# Altium footprint library SWARMUS_LIB.PcbLib: 114 footprints (part 1 of 8)
Each footprint in its own frame and in the unit in brackets; x right, y up, seen from the top. Pads: shape width x height; smd on the part's side, far side on the other; paste and mask are expansions set on the pad; w line width, h text height; cw(c..) or ccw(c..) is an arc to the next point about the centre after c.
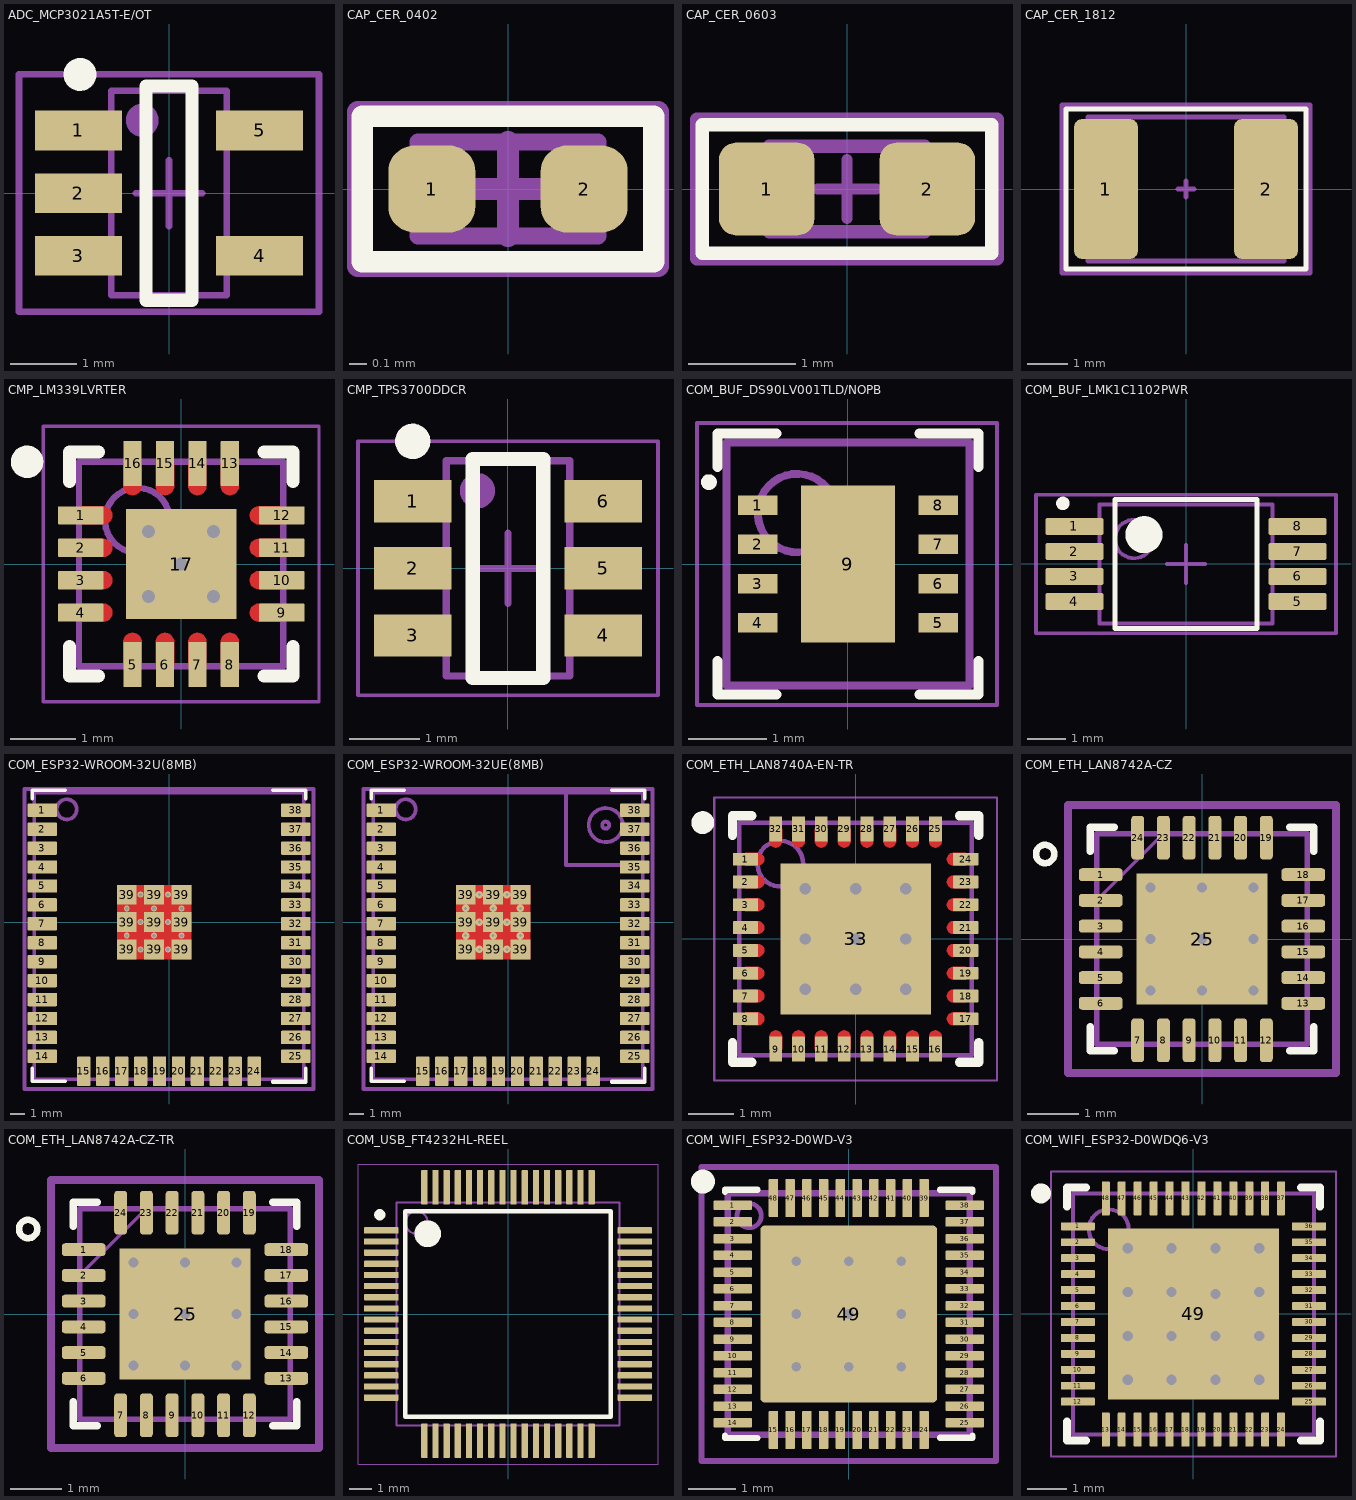
[diagram p0: the footprints below, top view; thin cyan lines are the x and y axes]

## ADC_MCP3021A5T-E/OT [mm]
pads (5):
  rect 1.321x0.6 smd paste-0.05 mask+0.07: 1(-1.375,0.95) 2(-1.375,0) 3(-1.375,-0.95) 4(1.375,-0.95) 5(1.375,0.95)
Top Overlay:
  circle w0.25: c-1.35,1.8 r0.125
  lines w0.2: 0.35,1.625 0.35,-1.625 -0.35,-1.625 -0.35,1.625 0.35,1.625
Top Assembly Drawing:
  circle w0.25: c-0.406,1.104 r0.125
  lines w0.1: -0.875,-1.55 0.875,-1.55 0.875,1.55 -0.875,1.55 -0.875,-1.55
Top Courtyard:
  lines w0.1: -0.5,0 0.5,0 ; 0,-0.5 0,0.5 ; -2.275,-1.8 -2.275,1.8 2.275,1.8 2.275,-1.8 -2.275,-1.8
3D body "SOT95P280X145-5N.step": height 1.45, standoff 0, extent -1.5,-1.55 1.5,1.55

## CAP_CER_0402 [mil] "Ceramic Capacitor - 0402"
height 23.62
pads (2):
  rrect60% 20x20 smd paste+0 mask+1.97: 1(-17.5,0) 2(17.5,0)
Top Overlay:
  lines w5: -33.46,-16.73 33.46,-16.73 33.46,16.73 -33.46,16.73 -33.46,-16.73
Top Assembly Drawing:
  lines w3.94: -20.67,-10.83 20.67,-10.83 20.67,10.83 -20.67,10.83 -20.67,-10.83
Top Courtyard:
  lines w5: -10.83,0 10.83,0 ; 0,-10.83 0,10.83 ; -34.45,-17.72 -34.45,17.72 34.45,17.72 34.45,-17.72 -34.45,-17.72
3D body "Cap0402.step": height 19.68, standoff 0, extent -19.37,-9.69 20,10

## CAP_CER_0603 [mil] "Ceramic Capacitor - 0603"
height 31.5
pads (2):
  rrect35% 35x34 smd paste+0 mask+1.97: 1(-29.5,0) 2(29.5,0)
Top Overlay:
  lines w5: -53.15,-23.62 53.15,-23.62 53.15,23.62 -53.15,23.62 -53.15,-23.62
Top Assembly Drawing:
  lines w5: -28.54,-15.75 28.54,-15.75 28.54,15.75 -28.54,15.75 -28.54,-15.75
Top Courtyard:
  lines w3.94: -10.83,0 10.83,0 ; 0,-10.83 0,10.83
  lines w5: -55.12,-25.59 55.12,-25.59 55.12,25.59 -55.12,25.59 -55.12,-25.59
3D body "Cap0603.step": height 35.43, standoff 0, extent -31.5,-15.75 31.5,15.75

## CAP_CER_1812 [mm]
height 2.8
pads (2):
  rrect25% 1.6x3.5 smd paste-0.025 mask+0.05: 1(-2,0) 2(2,0)
Top Overlay:
  lines w0.127: -3,-2 3,-2 3,2 -3,2 -3,-2
Top Assembly Drawing:
  lines w0.127: -2.45,-1.8 2.45,-1.8 2.45,1.8 -2.45,1.8 -2.45,-1.8
Top Courtyard:
  lines w0.127: -0.2,0 0.2,0 ; 0,-0.2 0,0.2 ; -3.1,-2.1 -3.1,2.1 3.1,2.1 3.1,-2.1 -3.1,-2.1
3D body "User Library-SMD Ceramic Capacitors_1812 (4532)_GE.step": height 1.3, standoff 0, extent -2.304,-1.6 2.304,1.6

## CMP_LM339LVRTER [mm] "WQFN-16"
height 0.8
pads (17):
  rrect10% 0.7x0.28 smd paste-0.025 mask+0.055: 1(-1.55,0.75) 2(-1.55,0.25) 3(-1.55,-0.25) 4(-1.55,-0.75) 9(1.55,-0.75) 10(1.55,-0.25) 11(1.55,0.25) 12(1.55,0.75)
  rrect10% 0.28x0.7 smd paste-0.025 mask+0.055: 5(-0.75,-1.55) 6(-0.25,-1.55) 7(0.25,-1.55) 8(0.75,-1.55) 13(0.75,1.55) 14(0.25,1.55) 15(-0.25,1.55) 16(-0.75,1.55)
  rect 1.7x1.7 smd paste-1.7 mask+0: 17(0,0)
via 0,0 diameter 0.5 hole 0.2
via -0.5,0.5 diameter 0.5 hole 0.2
via 0.5,0.5 diameter 0.5 hole 0.2
via 0.5,-0.5 diameter 0.5 hole 0.2
via -0.5,-0.5 diameter 0.5 hole 0.2
Top Layer:
  region: 0.39,-1.2 0.39,-1.186 0.385,-1.159 0.374,-1.134 0.359,-1.111 0.339,-1.091 0.316,-1.076 0.291,-1.065 0.264,-1.06 0.236,-1.06 0.209,-1.065 0.184,-1.076 0.161,-1.091 0.141,-1.111 0.126,-1.134 0.115,-1.159 0.11,-1.186 0.11,-1.2 0.11,-1.55 0.39,-1.55
  region: -0.11,-1.2 -0.11,-1.186 -0.115,-1.159 -0.126,-1.134 -0.141,-1.111 -0.161,-1.091 -0.184,-1.076 -0.209,-1.065 -0.236,-1.06 -0.264,-1.06 -0.291,-1.065 -0.316,-1.076 -0.339,-1.091 -0.359,-1.111 -0.374,-1.134 -0.385,-1.159 -0.39,-1.186 -0.39,-1.2 -0.39,-1.55 -0.11,-1.55
  region: -0.61,-1.2 -0.61,-1.186 -0.615,-1.159 -0.626,-1.134 -0.641,-1.111 -0.661,-1.091 -0.684,-1.076 -0.709,-1.065 -0.736,-1.06 -0.764,-1.06 -0.791,-1.065 -0.816,-1.076 -0.839,-1.091 -0.859,-1.111 -0.874,-1.134 -0.885,-1.159 -0.89,-1.186 -0.89,-1.2 -0.89,-1.55 -0.61,-1.55
  region: 0.89,-1.2 0.89,-1.186 0.885,-1.159 0.874,-1.134 0.859,-1.111 0.839,-1.091 0.816,-1.076 0.791,-1.065 0.764,-1.06 0.736,-1.06 0.709,-1.065 0.684,-1.076 0.661,-1.091 0.641,-1.111 0.626,-1.134 0.615,-1.159 0.61,-1.186 0.61,-1.2 0.61,-1.55 0.89,-1.55
  region: -1.2,-0.39 -1.186,-0.39 -1.159,-0.385 -1.134,-0.374 -1.111,-0.359 -1.091,-0.339 -1.076,-0.316 -1.065,-0.291 -1.06,-0.264 -1.06,-0.236 -1.065,-0.209 -1.076,-0.184 -1.091,-0.161 -1.111,-0.141 -1.134,-0.126 -1.159,-0.115 -1.186,-0.11 -1.2,-0.11 -1.55,-0.11 -1.55,-0.39
  region: -1.2,0.11 -1.186,0.11 -1.159,0.115 -1.134,0.126 -1.111,0.141 -1.091,0.161 -1.076,0.184 -1.065,0.209 -1.06,0.236 -1.06,0.264 -1.065,0.291 -1.076,0.316 -1.091,0.339 -1.111,0.359 -1.134,0.374 -1.159,0.385 -1.186,0.39 -1.2,0.39 -1.55,0.39 -1.55,0.11
  region: -1.2,0.61 -1.186,0.61 -1.159,0.615 -1.134,0.626 -1.111,0.641 -1.091,0.661 -1.076,0.684 -1.065,0.709 -1.06,0.736 -1.06,0.764 -1.065,0.791 -1.076,0.816 -1.091,0.839 -1.111,0.859 -1.134,0.874 -1.159,0.885 -1.186,0.89 -1.2,0.89 -1.55,0.89 -1.55,0.61
  region: -1.2,-0.89 -1.186,-0.89 -1.159,-0.885 -1.134,-0.874 -1.111,-0.859 -1.091,-0.839 -1.076,-0.816 -1.065,-0.791 -1.06,-0.764 -1.06,-0.736 -1.065,-0.709 -1.076,-0.684 -1.091,-0.661 -1.111,-0.641 -1.134,-0.626 -1.159,-0.615 -1.186,-0.61 -1.2,-0.61 -1.55,-0.61 -1.55,-0.89
  region: -0.39,1.2 -0.39,1.186 -0.385,1.159 -0.374,1.134 -0.359,1.111 -0.339,1.091 -0.316,1.076 -0.291,1.065 -0.264,1.06 -0.236,1.06 -0.209,1.065 -0.184,1.076 -0.161,1.091 -0.141,1.111 -0.126,1.134 -0.115,1.159 -0.11,1.186 -0.11,1.2 -0.11,1.55 -0.39,1.55
  region: 0.11,1.2 0.11,1.186 0.115,1.159 0.126,1.134 0.141,1.111 0.161,1.091 0.184,1.076 0.209,1.065 0.236,1.06 0.264,1.06 0.291,1.065 0.316,1.076 0.339,1.091 0.359,1.111 0.374,1.134 0.385,1.159 0.39,1.186 0.39,1.2 0.39,1.55 0.11,1.55
  region: 0.61,1.2 0.61,1.186 0.615,1.159 0.626,1.134 0.641,1.111 0.661,1.091 0.684,1.076 0.709,1.065 0.736,1.06 0.764,1.06 0.791,1.065 0.816,1.076 0.839,1.091 0.859,1.111 0.874,1.134 0.885,1.159 0.89,1.186 0.89,1.2 0.89,1.55 0.61,1.55
  region: -0.89,1.2 -0.89,1.186 -0.885,1.159 -0.874,1.134 -0.859,1.111 -0.839,1.091 -0.816,1.076 -0.791,1.065 -0.764,1.06 -0.736,1.06 -0.709,1.065 -0.684,1.076 -0.661,1.091 -0.641,1.111 -0.626,1.134 -0.615,1.159 -0.61,1.186 -0.61,1.2 -0.61,1.55 -0.89,1.55
  region: 1.2,0.39 1.186,0.39 1.159,0.385 1.134,0.374 1.111,0.359 1.091,0.339 1.076,0.316 1.065,0.291 1.06,0.264 1.06,0.236 1.065,0.209 1.076,0.184 1.091,0.161 1.111,0.141 1.134,0.126 1.159,0.115 1.186,0.11 1.2,0.11 1.55,0.11 1.55,0.39
  region: 1.2,-0.11 1.186,-0.11 1.159,-0.115 1.134,-0.126 1.111,-0.141 1.091,-0.161 1.076,-0.184 1.065,-0.209 1.06,-0.236 1.06,-0.264 1.065,-0.291 1.076,-0.316 1.091,-0.339 1.111,-0.359 1.134,-0.374 1.159,-0.385 1.186,-0.39 1.2,-0.39 1.55,-0.39 1.55,-0.11
  region: 1.2,-0.61 1.186,-0.61 1.159,-0.615 1.134,-0.626 1.111,-0.641 1.091,-0.661 1.076,-0.684 1.065,-0.709 1.06,-0.736 1.06,-0.764 1.065,-0.791 1.076,-0.816 1.091,-0.839 1.111,-0.859 1.134,-0.874 1.159,-0.885 1.186,-0.89 1.2,-0.89 1.55,-0.89 1.55,-0.61
  region: 1.2,0.89 1.186,0.89 1.159,0.885 1.134,0.874 1.111,0.859 1.091,0.839 1.076,0.816 1.065,0.791 1.06,0.764 1.06,0.736 1.065,0.709 1.076,0.684 1.091,0.661 1.111,0.641 1.134,0.626 1.159,0.615 1.186,0.61 1.2,0.61 1.55,0.61 1.55,0.89
Top Overlay:
  circle w0.25: c-2.375,1.575 r0.125
  lines w0.2: -1.725,-1.275 -1.725,-1.725 -1.275,-1.725 ; -1.725,1.275 -1.725,1.725 -1.275,1.725 ; 1.275,-1.725 1.725,-1.725 1.725,-1.275 ; 1.275,1.725 1.725,1.725 1.725,1.275
Top Paste:
  rectangle: -0.8,0.1 -0.1,0.8
  region: -0.1,-0.8 -0.1,-0.1 -0.8,-0.1 -0.8,-0.8
  region: 0.8,-0.1 0.1,-0.1 0.1,-0.8 0.8,-0.8
  region: 0.1,0.8 0.1,0.1 0.8,0.1 0.8,0.8
Top Assembly Drawing:
  circle w0.1: c-0.675,0.675 r0.5
  lines w0.1: -1.575,-1.575 -1.575,1.575 1.575,1.575 1.575,-1.575 -1.575,-1.575
Top Courtyard:
  lines w0.05: -2.125,-2.125 -2.125,2.125 2.125,2.125 2.125,-2.125 -2.125,-2.125
  lines w0.1: -0.5,0 0.5,0 ; 0,-0.5 0,0.5
3D body "QFN50P300X300X80_HS-17N.step": height 0.8, standoff 0, extent -1.576,-1.576 1.576,1.576

## CMP_TPS3700DDCR [mm]
height 1.12
pads (6):
  rect 1.1x0.6 smd paste+0 mask+0.07: 1(-1.35,0.95) 2(-1.35,0) 3(-1.35,-0.95) 4(1.35,-0.95) 5(1.35,0) 6(1.35,0.95)
Top Overlay:
  circle w0.25: c-1.35,1.8 r0.125
  lines w0.2: -0.5,-1.55 0.5,-1.55 0.5,1.55 -0.5,1.55 -0.5,-1.55
Top Assembly Drawing:
  circle w0.25: c-0.432,1.1 r0.125
  lines w0.1: -0.875,-1.525 -0.875,1.525 0.875,1.525 0.875,-1.525 -0.875,-1.525
Top Courtyard:
  lines w0.05: -2.125,-1.8 -2.125,1.8 2.125,1.8 2.125,-1.8 -2.125,-1.8
  lines w0.1: -0.5,0 0.5,0 ; 0,-0.5 0,0.5
3D body "SOT95P280X110-6N.step": height 1.1, standoff 0, extent -1.525,-1.525 1.525,1.525

## COM_BUF_DS90LV001TLD/NOPB [mm] "SON, 8-Leads, Body 3.00x3.00mm, Pitch 0.50mm, Thermal Pad 2.00x1.20mm, IPC Medium Density"
height 0.8
pads (9):
  rect 0.5x0.25 smd paste-0.025 mask+0.07: 1(-1.15,0.75) 2(-1.15,0.25) 3(-1.15,-0.25) 4(-1.15,-0.75) 5(1.15,-0.75) 6(1.15,-0.25) 7(1.15,0.25) 8(1.15,0.75)
  rect 1.2x2 smd paste-0.025 mask+0.07: 9(0,0)
Top Overlay:
  circle w0.1: c-1.773,1.044 r0.05
  lines w0.127: -1.664,-1.238 -1.664,-1.663 -0.908,-1.663 ; -1.664,1.239 -1.664,1.664 -0.908,1.664 ; 0.908,-1.663 1.663,-1.663 1.663,-1.238 ; 0.908,1.664 1.663,1.664 1.663,1.239
Top Assembly Drawing:
  circle w0.1: c-0.65,0.65 r0.5
  lines w0.1: -1.55,-1.55 -1.55,1.55 1.55,1.55 1.55,-1.55 -1.55,-1.55
Top Courtyard:
  lines w0.05: -1.925,-1.8 -1.925,1.8 1.9,1.8 1.9,-1.8 -1.925,-1.8
  lines w0.1: -0.5,0 0.5,0 ; 0,-0.5 0,0.5
3D body "SON50P300X80_HS-9N.step": height 0.8, standoff 0, extent -1.55,-1.55 1.55,1.55

## COM_BUF_LMK1C1102PWR [mm] "TSOP, 8-Leads, Body 3,00x4,40mm, Pitch 0,65mm, IPC Medium Density"
height 1.2
pads (8):
  rrect20% 1.5x0.45 smd paste-0.05 mask+0.05: 1(-2.9,0.975) 2(-2.9,0.325) 3(-2.9,-0.325) 4(-2.9,-0.975) 5(2.9,-0.975) 6(2.9,-0.325) 7(2.9,0.325) 8(2.9,0.975)
Top Overlay:
  circle w0.6: c-1.092,0.762 r0.18
  circle w0.25: c-3.2,1.575 r0.05
  lines w0.127: -1.85,-1.676 1.85,-1.676 1.85,1.676 -1.85,1.676 -1.85,-1.676
Top Assembly Drawing:
  circle w0.1: c-1.35,0.65 r0.5
  lines w0.1: -2.25,-1.55 2.25,-1.55 2.25,1.55 -2.25,1.55 -2.25,-1.55
Top Courtyard:
  lines w0.1: -0.5,0 0.5,0 ; 0,-0.5 0,0.5 ; -3.9,-1.8 -3.9,1.8 3.9,1.8 3.9,-1.8 -3.9,-1.8
3D body "COM_BUF_LMK1C1102PWR_1.step": height 1.2, standoff 0, extent -3.2,-1.55 3.2,1.55

## COM_ESP32-WROOM-32U(8MB) [mm]
pads (47):
  rrect20% 2x0.9 smd paste-0.025 mask+0.07: 1(-8.5,7.5) 2(-8.5,6.23) 3(-8.5,4.96) 4(-8.5,3.69) 5(-8.5,2.42) 6(-8.5,1.15) 7(-8.5,-0.12) 8(-8.5,-1.39) 9(-8.5,-2.66) 10(-8.5,-3.93) 11(-8.5,-5.2) 12(-8.5,-6.47) 13(-8.5,-7.74) 14(-8.5,-9.01) 25(8.5,-9.01) 26(8.5,-7.74) 27(8.5,-6.47) 28(8.5,-5.2) 29(8.5,-3.93) 30(8.5,-2.66) 31(8.5,-1.39) 32(8.5,-0.12) 33(8.5,1.15) 34(8.5,2.42) 35(8.5,3.69) 36(8.5,4.96) 37(8.5,6.23) 38(8.5,7.5)
  rrect20% 0.9x2 smd paste-0.025 mask+0.07: 15(-5.715,-10.01) 16(-4.445,-10.01) 17(-3.175,-10.01) 18(-1.905,-10.01) 19(-0.635,-10.01) 20(0.635,-10.01) 21(1.905,-10.01) 22(3.175,-10.01) 23(4.445,-10.01) 24(5.715,-10.01)
  rrect0% 1.33x1.33 smd paste-0.025 mask+0.07: 39(-2.835,-1.835) 39(-2.835,0) 39(-2.835,1.835) 39(-1,-1.835) 39(-1,0) 39(-1,1.835) 39(0.835,-1.835) 39(0.835,0) 39(0.835,1.835)
via -1,0.918 diameter 0.4 hole 0.254
via -2.835,0.918 diameter 0.4 hole 0.254
via 0.835,0.918 diameter 0.4 hole 0.254
via 0.835,-0.917 diameter 0.4 hole 0.254
via -2.835,-0.917 diameter 0.4 hole 0.254
via -0.083,1.835 diameter 0.4 hole 0.254
via -0.083,-1.835 diameter 0.4 hole 0.254
via -0.083,0 diameter 0.4 hole 0.254
via -1.917,1.835 diameter 0.4 hole 0.254
via -1.917,-1.835 diameter 0.4 hole 0.254
via -1.917,0 diameter 0.4 hole 0.254
via -1,-0.917 diameter 0.4 hole 0.254
Top Layer:
  rectangle: -3.5,-2.5 1.5,2.5
Top Overlay:
  lines w0.254: -9.173,-9.804 -9.173,-10.678 -6.967,-10.678 ; -9.173,8.294 -9.173,8.834 -6.967,8.834 ; 6.967,-10.729 9.173,-10.729 9.173,-9.856 ; 6.967,8.834 9.173,8.834 9.173,8.294 ; 9.173,-10.678 9.173,-9.804 9.173,-10.678 ; 9.173,-10.678 6.967,-10.678 9.173,-10.678
Top Assembly Drawing:
  circle w0.254: c-6.863,7.562 r0.675
  lines w0.254: -9.035,-10.55 9.035,-10.55 9.035,8.69 -9.035,8.69 -9.035,-10.55
Top Courtyard:
  lines w0.1: -0.5,0 0.5,0 ; 0,-0.5 0,0.5
  lines w0.254: -9.7,-11.2 -9.7,8.925 9.7,8.925 9.7,-11.2 -9.7,-11.2
3D body "ESp32-WROOM-32U v3.step": height 3.4, standoff -0.04, extent -9.035,-10.55 9.035,8.69

## COM_ESP32-WROOM-32UE(8MB) [mm]
pads (47):
  rrect20% 2x0.9 smd paste-0.025 mask+0.07: 1(-8.5,7.5) 2(-8.5,6.23) 3(-8.5,4.96) 4(-8.5,3.69) 5(-8.5,2.42) 6(-8.5,1.15) 7(-8.5,-0.12) 8(-8.5,-1.39) 9(-8.5,-2.66) 10(-8.5,-3.93) 11(-8.5,-5.2) 12(-8.5,-6.47) 13(-8.5,-7.74) 14(-8.5,-9.01) 25(8.5,-9.01) 26(8.5,-7.74) 27(8.5,-6.47) 28(8.5,-5.2) 29(8.5,-3.93) 30(8.5,-2.66) 31(8.5,-1.39) 32(8.5,-0.12) 33(8.5,1.15) 34(8.5,2.42) 35(8.5,3.69) 36(8.5,4.96) 37(8.5,6.23) 38(8.5,7.5)
  rrect20% 0.9x2 smd paste-0.025 mask+0.07: 15(-5.715,-10.01) 16(-4.445,-10.01) 17(-3.175,-10.01) 18(-1.905,-10.01) 19(-0.635,-10.01) 20(0.635,-10.01) 21(1.905,-10.01) 22(3.175,-10.01) 23(4.445,-10.01) 24(5.715,-10.01)
  rrect0% 1.33x1.33 smd paste-0.025 mask+0.07: 39(-2.835,-1.835) 39(-2.835,0) 39(-2.835,1.835) 39(-1,-1.835) 39(-1,0) 39(-1,1.835) 39(0.835,-1.835) 39(0.835,0) 39(0.835,1.835)
via -1,-0.917 diameter 0.5 hole 0.2
via -1.917,0 diameter 0.5 hole 0.2
via -1.917,-1.835 diameter 0.5 hole 0.2
via -1.917,1.835 diameter 0.5 hole 0.2
via -0.083,0 diameter 0.5 hole 0.2
via -0.083,-1.835 diameter 0.5 hole 0.2
via -0.083,1.835 diameter 0.5 hole 0.2
via -2.835,-0.917 diameter 0.5 hole 0.2
via 0.835,-0.917 diameter 0.5 hole 0.2
via 0.835,0.918 diameter 0.5 hole 0.2
via -2.835,0.918 diameter 0.5 hole 0.2
via -1,0.918 diameter 0.5 hole 0.2
Top Layer:
  rectangle: -3.5,-2.5 1.5,2.5
Top Overlay:
  lines w0.254: -9.173,-9.804 -9.173,-10.678 -6.967,-10.678 ; -9.173,8.294 -9.173,8.834 -6.967,8.834 ; 6.967,-10.729 9.173,-10.729 9.173,-9.856 ; 6.967,8.834 9.173,8.834 9.173,8.294 ; 9.173,-10.678 6.967,-10.678 9.173,-10.678 ; 9.173,-10.678 9.173,-9.804 9.173,-10.678
Top Assembly Drawing:
  circle w0.254: c6.553,6.502 r0.235
  circle w0.254: c6.553,6.502 r1.143
  circle w0.254: c-6.863,7.562 r0.675
  lines w0.254: 3.886,8.69 3.886,3.835 9.035,3.835 ; -9.035,-10.55 -9.035,8.69 9.035,8.69 9.035,-10.55 -9.035,-10.55
Top Courtyard:
  lines w0.1: -0.5,0 0.5,0 ; 0,-0.5 0,0.5
  lines w0.254: -9.7,-11.2 9.7,-11.2 9.7,8.925 -9.7,8.925 -9.7,-11.2
3D body "ESp32-WROOM-32U v3.step": height 3.4, standoff -0.04, extent -9.035,-10.55 9.035,8.69

## COM_ETH_LAN8740A-EN-TR [mm] "QFN, 32-Leads"
height 1
pads (33):
  rrect10% 0.55x0.28 smd paste-0.025 mask+0.05: 1(-2.415,1.75) 2(-2.415,1.25) 3(-2.415,0.75) 4(-2.415,0.25) 5(-2.415,-0.25) 6(-2.415,-0.75) 7(-2.415,-1.25) 8(-2.415,-1.75) 17(2.415,-1.75) 18(2.415,-1.25) 19(2.415,-0.75) 20(2.415,-0.25) 21(2.415,0.25) 22(2.415,0.75) 23(2.415,1.25) 24(2.415,1.75)
  rrect10% 0.28x0.55 smd paste-0.025 mask+0.05: 9(-1.75,-2.415) 10(-1.25,-2.415) 11(-0.75,-2.415) 12(-0.25,-2.415) 13(0.25,-2.415) 14(0.75,-2.415) 15(1.25,-2.415) 16(1.75,-2.415) 25(1.75,2.415) 26(1.25,2.415) 27(0.75,2.415) 28(0.25,2.415) 29(-0.25,2.415) 30(-0.75,2.415) 31(-1.25,2.415) 32(-1.75,2.415)
  rect 3.3x3.3 smd paste-3.3 mask+0.05: 33(0,0)
via 1.1,-1.1 diameter 0.5 hole 0.25
via 0,-1.1 diameter 0.5 hole 0.25
via -1.1,-1.1 diameter 0.5 hole 0.25
via 1.1,0 diameter 0.5 hole 0.25
via 0,0 diameter 0.5 hole 0.25
via -1.1,0 diameter 0.5 hole 0.25
via 1.1,1.1 diameter 0.5 hole 0.25
via 0,1.1 diameter 0.5 hole 0.25
via -1.1,1.1 diameter 0.5 hole 0.25
Top Layer:
  region: -2.141,1.39 -2.127,1.39 -2.1,1.385 -2.075,1.374 -2.052,1.359 -2.032,1.339 -2.017,1.316 -2.006,1.291 -2.001,1.264 -2.001,1.236 -2.006,1.209 -2.017,1.184 -2.032,1.161 -2.052,1.141 -2.075,1.126 -2.1,1.115 -2.127,1.11 -2.141,1.11 -2.415,1.11 -2.415,1.39
  region: -2.141,0.89 -2.127,0.89 -2.1,0.885 -2.075,0.874 -2.052,0.859 -2.032,0.839 -2.017,0.816 -2.006,0.791 -2.001,0.764 -2.001,0.736 -2.006,0.709 -2.017,0.684 -2.032,0.661 -2.052,0.641 -2.075,0.626 -2.1,0.615 -2.127,0.61 -2.141,0.61 -2.415,0.61 -2.415,0.89
  region: -2.141,0.39 -2.127,0.39 -2.1,0.385 -2.075,0.374 -2.052,0.359 -2.032,0.339 -2.017,0.316 -2.006,0.291 -2.001,0.264 -2.001,0.236 -2.006,0.209 -2.017,0.184 -2.032,0.161 -2.052,0.141 -2.075,0.126 -2.1,0.115 -2.127,0.11 -2.141,0.11 -2.415,0.11 -2.415,0.39
  region: -2.141,-0.11 -2.127,-0.11 -2.1,-0.115 -2.075,-0.126 -2.052,-0.141 -2.032,-0.161 -2.017,-0.184 -2.006,-0.209 -2.001,-0.236 -2.001,-0.264 -2.006,-0.291 -2.017,-0.316 -2.032,-0.339 -2.052,-0.359 -2.075,-0.374 -2.1,-0.385 -2.127,-0.39 -2.141,-0.39 -2.415,-0.39 -2.415,-0.11
  region: -2.141,-0.61 -2.127,-0.61 -2.1,-0.615 -2.075,-0.626 -2.052,-0.641 -2.032,-0.661 -2.017,-0.684 -2.006,-0.709 -2.001,-0.736 -2.001,-0.764 -2.006,-0.791 -2.017,-0.816 -2.032,-0.839 -2.052,-0.859 -2.075,-0.874 -2.1,-0.885 -2.127,-0.89 -2.141,-0.89 -2.415,-0.89 -2.415,-0.61
  region: -2.141,-1.11 -2.127,-1.11 -2.1,-1.115 -2.075,-1.126 -2.052,-1.141 -2.032,-1.161 -2.017,-1.184 -2.006,-1.209 -2.001,-1.236 -2.001,-1.264 -2.006,-1.291 -2.017,-1.316 -2.032,-1.339 -2.052,-1.359 -2.075,-1.374 -2.1,-1.385 -2.127,-1.39 -2.141,-1.39 -2.415,-1.39 -2.415,-1.11
  region: -2.141,-1.61 -2.127,-1.61 -2.1,-1.615 -2.075,-1.626 -2.052,-1.641 -2.032,-1.661 -2.017,-1.684 -2.006,-1.709 -2.001,-1.736 -2.001,-1.764 -2.006,-1.791 -2.017,-1.816 -2.032,-1.839 -2.052,-1.859 -2.075,-1.874 -2.1,-1.885 -2.127,-1.89 -2.141,-1.89 -2.415,-1.89 -2.415,-1.61
  region: -1.89,-2.141 -1.89,-2.127 -1.885,-2.1 -1.874,-2.075 -1.859,-2.052 -1.839,-2.032 -1.816,-2.017 -1.791,-2.006 -1.764,-2.001 -1.736,-2.001 -1.709,-2.006 -1.684,-2.017 -1.661,-2.032 -1.641,-2.052 -1.626,-2.075 -1.615,-2.1 -1.61,-2.127 -1.61,-2.141 -1.61,-2.415 -1.89,-2.415
  region: -1.39,-2.141 -1.39,-2.127 -1.385,-2.1 -1.374,-2.075 -1.359,-2.052 -1.339,-2.032 -1.316,-2.017 -1.291,-2.006 -1.264,-2.001 -1.236,-2.001 -1.209,-2.006 -1.184,-2.017 -1.161,-2.032 -1.141,-2.052 -1.126,-2.075 -1.115,-2.1 -1.11,-2.127 -1.11,-2.141 -1.11,-2.415 -1.39,-2.415
  region: -0.89,-2.141 -0.89,-2.127 -0.885,-2.1 -0.874,-2.075 -0.859,-2.052 -0.839,-2.032 -0.816,-2.017 -0.791,-2.006 -0.764,-2.001 -0.736,-2.001 -0.709,-2.006 -0.684,-2.017 -0.661,-2.032 -0.641,-2.052 -0.626,-2.075 -0.615,-2.1 -0.61,-2.127 -0.61,-2.141 -0.61,-2.415 -0.89,-2.415
  region: -0.39,-2.141 -0.39,-2.127 -0.385,-2.1 -0.374,-2.075 -0.359,-2.052 -0.339,-2.032 -0.316,-2.017 -0.291,-2.006 -0.264,-2.001 -0.236,-2.001 -0.209,-2.006 -0.184,-2.017 -0.161,-2.032 -0.141,-2.052 -0.126,-2.075 -0.115,-2.1 -0.11,-2.127 -0.11,-2.141 -0.11,-2.415 -0.39,-2.415
  region: 0.11,-2.141 0.11,-2.127 0.115,-2.1 0.126,-2.075 0.141,-2.052 0.161,-2.032 0.184,-2.017 0.209,-2.006 0.236,-2.001 0.264,-2.001 0.291,-2.006 0.316,-2.017 0.339,-2.032 0.359,-2.052 0.374,-2.075 0.385,-2.1 0.39,-2.127 0.39,-2.141 0.39,-2.415 0.11,-2.415
  region: 0.61,-2.141 0.61,-2.127 0.615,-2.1 0.626,-2.075 0.641,-2.052 0.661,-2.032 0.684,-2.017 0.709,-2.006 0.736,-2.001 0.764,-2.001 0.791,-2.006 0.816,-2.017 0.839,-2.032 0.859,-2.052 0.874,-2.075 0.885,-2.1 0.89,-2.127 0.89,-2.141 0.89,-2.415 0.61,-2.415
  region: 1.11,-2.141 1.11,-2.127 1.115,-2.1 1.126,-2.075 1.141,-2.052 1.161,-2.032 1.184,-2.017 1.209,-2.006 1.236,-2.001 1.264,-2.001 1.291,-2.006 1.316,-2.017 1.339,-2.032 1.359,-2.052 1.374,-2.075 1.385,-2.1 1.39,-2.127 1.39,-2.141 1.39,-2.415 1.11,-2.415
  region: 1.61,-2.141 1.61,-2.127 1.615,-2.1 1.626,-2.075 1.641,-2.052 1.661,-2.032 1.684,-2.017 1.709,-2.006 1.736,-2.001 1.764,-2.001 1.791,-2.006 1.816,-2.017 1.839,-2.032 1.859,-2.052 1.874,-2.075 1.885,-2.1 1.89,-2.127 1.89,-2.141 1.89,-2.415 1.61,-2.415
  region: 2.141,-1.89 2.127,-1.89 2.1,-1.885 2.075,-1.874 2.052,-1.859 2.032,-1.839 2.017,-1.816 2.006,-1.791 2.001,-1.764 2.001,-1.736 2.006,-1.709 2.017,-1.684 2.032,-1.661 2.052,-1.641 2.075,-1.626 2.1,-1.615 2.127,-1.61 2.141,-1.61 2.415,-1.61 2.415,-1.89
  region: 2.141,-1.39 2.127,-1.39 2.1,-1.385 2.075,-1.374 2.052,-1.359 2.032,-1.339 2.017,-1.316 2.006,-1.291 2.001,-1.264 2.001,-1.236 2.006,-1.209 2.017,-1.184 2.032,-1.161 2.052,-1.141 2.075,-1.126 2.1,-1.115 2.127,-1.11 2.141,-1.11 2.415,-1.11 2.415,-1.39
  region: 2.141,-0.89 2.127,-0.89 2.1,-0.885 2.075,-0.874 2.052,-0.859 2.032,-0.839 2.017,-0.816 2.006,-0.791 2.001,-0.764 2.001,-0.736 2.006,-0.709 2.017,-0.684 2.032,-0.661 2.052,-0.641 2.075,-0.626 2.1,-0.615 2.127,-0.61 2.141,-0.61 2.415,-0.61 2.415,-0.89
  region: 2.141,-0.39 2.127,-0.39 2.1,-0.385 2.075,-0.374 2.052,-0.359 2.032,-0.339 2.017,-0.316 2.006,-0.291 2.001,-0.264 2.001,-0.236 2.006,-0.209 2.017,-0.184 2.032,-0.161 2.052,-0.141 2.075,-0.126 2.1,-0.115 2.127,-0.11 2.141,-0.11 2.415,-0.11 2.415,-0.39
  region: 2.141,0.11 2.127,0.11 2.1,0.115 2.075,0.126 2.052,0.141 2.032,0.161 2.017,0.184 2.006,0.209 2.001,0.236 2.001,0.264 2.006,0.291 2.017,0.316 2.032,0.339 2.052,0.359 2.075,0.374 2.1,0.385 2.127,0.39 2.141,0.39 2.415,0.39 2.415,0.11
  region: 2.141,0.61 2.127,0.61 2.1,0.615 2.075,0.626 2.052,0.641 2.032,0.661 2.017,0.684 2.006,0.709 2.001,0.736 2.001,0.764 2.006,0.791 2.017,0.816 2.032,0.839 2.052,0.859 2.075,0.874 2.1,0.885 2.127,0.89 2.141,0.89 2.415,0.89 2.415,0.61
  region: 2.141,1.11 2.127,1.11 2.1,1.115 2.075,1.126 2.052,1.141 2.032,1.161 2.017,1.184 2.006,1.209 2.001,1.236 2.001,1.264 2.006,1.291 2.017,1.316 2.032,1.339 2.052,1.359 2.075,1.374 2.1,1.385 2.127,1.39 2.141,1.39 2.415,1.39 2.415,1.11
  region: 2.141,1.61 2.127,1.61 2.1,1.615 2.075,1.626 2.052,1.641 2.032,1.661 2.017,1.684 2.006,1.709 2.001,1.736 2.001,1.764 2.006,1.791 2.017,1.816 2.032,1.839 2.052,1.859 2.075,1.874 2.1,1.885 2.127,1.89 2.141,1.89 2.415,1.89 2.415,1.61
  region: 1.89,2.141 1.89,2.127 1.885,2.1 1.874,2.075 1.859,2.052 1.839,2.032 1.816,2.017 1.791,2.006 1.764,2.001 1.736,2.001 1.709,2.006 1.684,2.017 1.661,2.032 1.641,2.052 1.626,2.075 1.615,2.1 1.61,2.127 1.61,2.141 1.61,2.415 1.89,2.415
  region: 1.39,2.141 1.39,2.127 1.385,2.1 1.374,2.075 1.359,2.052 1.339,2.032 1.316,2.017 1.291,2.006 1.264,2.001 1.236,2.001 1.209,2.006 1.184,2.017 1.161,2.032 1.141,2.052 1.126,2.075 1.115,2.1 1.11,2.127 1.11,2.141 1.11,2.415 1.39,2.415
  region: 0.89,2.141 0.89,2.127 0.885,2.1 0.874,2.075 0.859,2.052 0.839,2.032 0.816,2.017 0.791,2.006 0.764,2.001 0.736,2.001 0.709,2.006 0.684,2.017 0.661,2.032 0.641,2.052 0.626,2.075 0.615,2.1 0.61,2.127 0.61,2.141 0.61,2.415 0.89,2.415
  region: 0.39,2.141 0.39,2.127 0.385,2.1 0.374,2.075 0.359,2.052 0.339,2.032 0.316,2.017 0.291,2.006 0.264,2.001 0.236,2.001 0.209,2.006 0.184,2.017 0.161,2.032 0.141,2.052 0.126,2.075 0.115,2.1 0.11,2.127 0.11,2.141 0.11,2.415 0.39,2.415
  region: -0.11,2.141 -0.11,2.127 -0.115,2.1 -0.126,2.075 -0.141,2.052 -0.161,2.032 -0.184,2.017 -0.209,2.006 -0.236,2.001 -0.264,2.001 -0.291,2.006 -0.316,2.017 -0.339,2.032 -0.359,2.052 -0.374,2.075 -0.385,2.1 -0.39,2.127 -0.39,2.141 -0.39,2.415 -0.11,2.415
  region: -0.61,2.141 -0.61,2.127 -0.615,2.1 -0.626,2.075 -0.641,2.052 -0.661,2.032 -0.684,2.017 -0.709,2.006 -0.736,2.001 -0.764,2.001 -0.791,2.006 -0.816,2.017 -0.839,2.032 -0.859,2.052 -0.874,2.075 -0.885,2.1 -0.89,2.127 -0.89,2.141 -0.89,2.415 -0.61,2.415
  region: -1.11,2.141 -1.11,2.127 -1.115,2.1 -1.126,2.075 -1.141,2.052 -1.161,2.032 -1.184,2.017 -1.209,2.006 -1.236,2.001 -1.264,2.001 -1.291,2.006 -1.316,2.017 -1.339,2.032 -1.359,2.052 -1.374,2.075 -1.385,2.1 -1.39,2.127 -1.39,2.141 -1.39,2.415 -1.11,2.415
  region: -1.61,2.141 -1.61,2.127 -1.615,2.1 -1.626,2.075 -1.641,2.052 -1.661,2.032 -1.684,2.017 -1.709,2.006 -1.736,2.001 -1.764,2.001 -1.791,2.006 -1.816,2.017 -1.839,2.032 -1.859,2.052 -1.874,2.075 -1.885,2.1 -1.89,2.127 -1.89,2.141 -1.89,2.415 -1.61,2.415
  region: -2.141,1.89 -2.127,1.89 -2.1,1.885 -2.075,1.874 -2.052,1.859 -2.032,1.839 -2.017,1.816 -2.006,1.791 -2.001,1.764 -2.001,1.736 -2.006,1.709 -2.017,1.684 -2.032,1.661 -2.052,1.641 -2.075,1.626 -2.1,1.615 -2.127,1.61 -2.141,1.61 -2.415,1.61 -2.415,1.89
Top Overlay:
  circle w0.25: c-3.35,2.55 r0.125
  lines w0.2: -2.7,-2.275 -2.7,-2.7 -2.275,-2.7 ; -2.7,2.275 -2.7,2.7 -2.275,2.7 ; 2.275,-2.7 2.7,-2.7 2.7,-2.275 ; 2.275,2.7 2.7,2.7 2.7,2.275
Top Paste:
  drawing of 36 lines, arcs and shapes, not listed
Top Solder:
  drawing of 32 lines, arcs and shapes, not listed
Top Assembly Drawing:
  circle w0.1: c-1.65,1.65 r0.5
  lines w0.1: -2.55,-2.55 2.55,-2.55 2.55,2.55 -2.55,2.55 -2.55,-2.55
Top Courtyard:
  lines w0.05: -3.1,-3.1 3.1,-3.1 3.1,3.1 -3.1,3.1 -3.1,-3.1
  lines w0.1: -0.5,0 0.5,0 ; 0,-0.5 0,0.5
3D body "QFN50P500X500X100_HS-33N.step": height 1, standoff 0, extent -2.551,-2.551 2.551,2.551

## COM_ETH_LAN8742A-CZ [mm] "24SQFN"
pads (25):
  rrect50% 0.85x0.25 smd paste+0 mask+0.05: 1(-1.968,1.25) 2(-1.968,0.75) 3(-1.968,0.25) 4(-1.968,-0.25) 5(-1.968,-0.75) 6(-1.968,-1.25) 13(1.968,-1.25) 14(1.968,-0.75) 15(1.968,-0.25) 16(1.968,0.25) 17(1.968,0.75) 18(1.968,1.25)
  rrect50% 0.25x0.85 smd paste+0 mask+0.05: 7(-1.25,-1.968) 8(-0.75,-1.968) 9(-0.25,-1.968) 10(0.25,-1.968) 11(0.75,-1.968) 12(1.25,-1.968) 19(1.25,1.968) 20(0.75,1.968) 21(0.25,1.968) 22(-0.25,1.968) 23(-0.75,1.968) 24(-1.25,1.968)
  rect 2.55x2.55 smd paste-1.283 mask+0: 25(0,0)
via -1,-1 diameter 0.5 hole 0.2
via -1,0 diameter 0.5 hole 0.2
via -1,1 diameter 0.5 hole 0.2
via 0,1 diameter 0.5 hole 0.2
via 1,1 diameter 0.5 hole 0.2
via 1,0 diameter 0.5 hole 0.2
via 1,-1 diameter 0.5 hole 0.2
via 0,-1 diameter 0.5 hole 0.2
via 0,0 diameter 0.5 hole 0.2
Top Overlay:
  circle w0.127: c-3.048,1.651 r0.178
  lines w0.152: -2.172,-1.71 -2.172,-2.172 -1.71,-2.172 ; -2.172,1.71 -2.172,2.172 -1.71,2.172 ; 1.71,-2.172 2.172,-2.172 2.172,-1.71 ; 1.71,2.172 2.172,2.172 2.172,1.71
Top Paste:
  region: -0.1,1.195 -1.195,1.195 -1.195,0.1 -0.1,0.1
  region: -0.1,-0.1 -1.195,-0.1 -1.195,-1.195 -0.1,-1.195
  region: 1.195,1.195 0.1,1.195 0.1,0.1 1.195,0.1
  region: 1.195,-0.1 0.1,-0.1 0.1,-1.195 1.195,-1.195
Top Assembly Drawing:
  lines w0.05: -2.045,0.75 -0.75,2.045
  lines w0.1: 2.045,-2.045 -2.045,-2.045 -2.045,2.045 2.044,2.045 ; 2.045,-2.045 2.045,-2.044 ; 2.045,-2.044 2.045,2.044 ; 2.044,2.045 2.045,2.044
Top 3D Model:
  lines w0.025: -2.045,0.775 -0.775,2.045 ; -2.045,-2.045 2.045,-2.045 2.045,2.045 -2.045,2.045 -2.045,-2.045 ; -2.045,-1.402 -2.045,-1.098 -2.045,-1.402 ; -2.045,-0.902 -2.045,-0.598 -2.045,-0.902 ; -2.045,-0.402 -2.045,-0.098 -2.045,-0.402 ; -2.045,0.098 -2.045,0.402 -2.045,0.098 ; -2.045,0.598 -2.045,0.902 -2.045,0.598 ; -2.045,1.098 -2.045,1.402 -2.045,1.098 ; -1.402,-2.045 -1.098,-2.045 -1.402,-2.045 ; -1.402,2.045 -1.098,2.045 -1.402,2.045 ; -0.902,-2.045 -0.598,-2.045 -0.902,-2.045 ; -0.902,2.045 -0.598,2.045 -0.902,2.045 ; -0.402,-2.045 -0.098,-2.045 -0.402,-2.045 ; -0.402,2.045 -0.098,2.045 -0.402,2.045 ; 0.098,-2.045 0.402,-2.045 0.098,-2.045 ; 0.098,2.045 0.402,2.045 0.098,2.045 ; 0.598,-2.045 0.902,-2.045 0.598,-2.045 ; 0.598,2.045 0.902,2.045 0.598,2.045 ; 1.098,-2.045 1.402,-2.045 1.098,-2.045 ; 1.098,2.045 1.402,2.045 1.098,2.045 ; 2.045,-1.402 2.045,-1.098 2.045,-1.402 ; 2.045,-0.902 2.045,-0.598 2.045,-0.902 ; 2.045,-0.402 2.045,-0.098 2.045,-0.402 ; 2.045,0.098 2.045,0.402 2.045,0.098 ; 2.045,0.598 2.045,0.902 2.045,0.598 ; 2.045,1.098 2.045,1.402 2.045,1.098
Top Courtyard:
  lines w0.152: -2.603,-2.603 -2.603,-1.631 -2.603,1.631 -2.603,2.603 -1.631,2.603 1.631,2.603 2.603,2.603 2.603,1.631 2.603,-1.631 2.603,-2.603 1.631,-2.603 -1.631,-2.603 -2.603,-2.603
3D body "SQFN24_4X4MC_MCH.step": height 1.4, standoff 0, extent -2.045,-2.045 2.045,2.045

## COM_ETH_LAN8742A-CZ-TR [mm] "24SQFN"
pads (25):
  rrect50% 0.85x0.25 smd paste+0 mask+0.05: 1(-1.968,1.25) 2(-1.968,0.75) 3(-1.968,0.25) 4(-1.968,-0.25) 5(-1.968,-0.75) 6(-1.968,-1.25) 13(1.968,-1.25) 14(1.968,-0.75) 15(1.968,-0.25) 16(1.968,0.25) 17(1.968,0.75) 18(1.968,1.25)
  rrect50% 0.25x0.85 smd paste+0 mask+0.05: 7(-1.25,-1.968) 8(-0.75,-1.968) 9(-0.25,-1.968) 10(0.25,-1.968) 11(0.75,-1.968) 12(1.25,-1.968) 19(1.25,1.968) 20(0.75,1.968) 21(0.25,1.968) 22(-0.25,1.968) 23(-0.75,1.968) 24(-1.25,1.968)
  rect 2.55x2.55 smd paste-1.283 mask+0: 25(0,0)
via -1,-1 diameter 0.5 hole 0.2
via -1,0 diameter 0.5 hole 0.2
via -1,1 diameter 0.5 hole 0.2
via 0,1 diameter 0.5 hole 0.2
via 1,1 diameter 0.5 hole 0.2
via 1,0 diameter 0.5 hole 0.2
via 1,-1 diameter 0.5 hole 0.2
via 0,-1 diameter 0.5 hole 0.2
via 0,0 diameter 0.5 hole 0.2
Top Overlay:
  circle w0.127: c-3.048,1.651 r0.178
  lines w0.152: -2.172,-1.71 -2.172,-2.172 -1.71,-2.172 ; -2.172,1.71 -2.172,2.172 -1.71,2.172 ; 1.71,-2.172 2.172,-2.172 2.172,-1.71 ; 1.71,2.172 2.172,2.172 2.172,1.71
Top Paste:
  region: -0.1,1.195 -1.195,1.195 -1.195,0.1 -0.1,0.1
  region: -0.1,-0.1 -1.195,-0.1 -1.195,-1.195 -0.1,-1.195
  region: 1.195,1.195 0.1,1.195 0.1,0.1 1.195,0.1
  region: 1.195,-0.1 0.1,-0.1 0.1,-1.195 1.195,-1.195
Top Assembly Drawing:
  lines w0.05: -2.045,0.75 -0.75,2.045
  lines w0.1: 2.045,-2.045 -2.045,-2.045 -2.045,2.045 2.044,2.045 ; 2.045,-2.045 2.045,-2.044 ; 2.045,-2.044 2.045,2.044 ; 2.044,2.045 2.045,2.044
Top 3D Model:
  lines w0.025: -2.045,0.775 -0.775,2.045 ; -2.045,-2.045 2.045,-2.045 2.045,2.045 -2.045,2.045 -2.045,-2.045 ; -2.045,-1.402 -2.045,-1.098 -2.045,-1.402 ; -2.045,-0.902 -2.045,-0.598 -2.045,-0.902 ; -2.045,-0.402 -2.045,-0.098 -2.045,-0.402 ; -2.045,0.098 -2.045,0.402 -2.045,0.098 ; -2.045,0.598 -2.045,0.902 -2.045,0.598 ; -2.045,1.098 -2.045,1.402 -2.045,1.098 ; -1.402,-2.045 -1.098,-2.045 -1.402,-2.045 ; -1.402,2.045 -1.098,2.045 -1.402,2.045 ; -0.902,-2.045 -0.598,-2.045 -0.902,-2.045 ; -0.902,2.045 -0.598,2.045 -0.902,2.045 ; -0.402,-2.045 -0.098,-2.045 -0.402,-2.045 ; -0.402,2.045 -0.098,2.045 -0.402,2.045 ; 0.098,-2.045 0.402,-2.045 0.098,-2.045 ; 0.098,2.045 0.402,2.045 0.098,2.045 ; 0.598,-2.045 0.902,-2.045 0.598,-2.045 ; 0.598,2.045 0.902,2.045 0.598,2.045 ; 1.098,-2.045 1.402,-2.045 1.098,-2.045 ; 1.098,2.045 1.402,2.045 1.098,2.045 ; 2.045,-1.402 2.045,-1.098 2.045,-1.402 ; 2.045,-0.902 2.045,-0.598 2.045,-0.902 ; 2.045,-0.402 2.045,-0.098 2.045,-0.402 ; 2.045,0.098 2.045,0.402 2.045,0.098 ; 2.045,0.598 2.045,0.902 2.045,0.598 ; 2.045,1.098 2.045,1.402 2.045,1.098
Top Courtyard:
  lines w0.152: -2.603,-2.603 -2.603,-1.631 -2.603,1.631 -2.603,2.603 -1.631,2.603 1.631,2.603 2.603,2.603 2.603,1.631 2.603,-1.631 2.603,-2.603 1.631,-2.603 -1.631,-2.603 -2.603,-2.603
3D body "SQFN24_4X4MC_MCH.step": height 1.4, standoff 0, extent -2.045,-2.045 2.045,2.045

## COM_USB_FT4232HL-REEL [mm] "TSQFP, 64-Leads, Body 10,00x10,00mm"
height 1.6
pads (64):
  rrect25% 1.56x0.28 smd paste-0.025 mask+0.055: 1(-5.68,3.75) 2(-5.68,3.25) 3(-5.68,2.75) 4(-5.68,2.25) 5(-5.68,1.75) 6(-5.68,1.25) 7(-5.68,0.75) 8(-5.68,0.25) 9(-5.68,-0.25) 10(-5.68,-0.75) 11(-5.68,-1.25) 12(-5.68,-1.75) 13(-5.68,-2.25) 14(-5.68,-2.75) 15(-5.68,-3.25) 16(-5.68,-3.75) 33(5.68,-3.75) 34(5.68,-3.25) 35(5.68,-2.75) 36(5.68,-2.25) 37(5.68,-1.75) 38(5.68,-1.25) 39(5.68,-0.75) 40(5.68,-0.25) 41(5.68,0.25) 42(5.68,0.75) 43(5.68,1.25) 44(5.68,1.75) 45(5.68,2.25) 46(5.68,2.75) 47(5.68,3.25) 48(5.68,3.75)
  rrect25% 0.28x1.56 smd paste-0.025 mask+0.055: 17(-3.75,-5.68) 18(-3.25,-5.68) 19(-2.75,-5.68) 20(-2.25,-5.68) 21(-1.75,-5.68) 22(-1.25,-5.68) 23(-0.75,-5.68) 24(-0.25,-5.68) 25(0.25,-5.68) 26(0.75,-5.68) 27(1.25,-5.68) 28(1.75,-5.68) 29(2.25,-5.68) 30(2.75,-5.68) 31(3.25,-5.68) 32(3.75,-5.68) 49(3.75,5.68) 50(3.25,5.68) 51(2.75,5.68) 52(2.25,5.68) 53(1.75,5.68) 54(1.25,5.68) 55(0.75,5.68) 56(0.25,5.68) 57(-0.25,5.68) 58(-0.75,5.68) 59(-1.25,5.68) 60(-1.75,5.68) 61(-2.25,5.68) 62(-2.75,5.68) 63(-3.25,5.68) 64(-3.75,5.68)
Top Overlay:
  circle w0.6: c-3.6,3.6 r0.3
  circle w0.25: c-5.75,4.45 r0.125
  lines w0.2: -4.6,-4.6 4.6,-4.6 4.6,4.6 -4.6,4.6 -4.6,-4.6
Top Assembly Drawing:
  circle w0.1: c-4.1,4.1 r0.5
  lines w0.1: -5,-5 5,-5 5,5 -5,5 -5,-5
Top Courtyard:
  lines w0.05: -6.725,-6.725 6.725,-6.725 6.725,6.725 -6.725,6.725 -6.725,-6.725
3D body "FT4232HL.STEP": height 1.58, standoff -0.02, extent -6,-6 6,6

## COM_WIFI_ESP32-D0WD-V3 [mm]
pads (49):
  rrect20% 0.8x0.2 smd paste-0.025 mask+0.05: 1(-2.425,2.275) 2(-2.425,1.925) 3(-2.425,1.575) 4(-2.425,1.225) 5(-2.425,0.875) 6(-2.425,0.525) 7(-2.425,0.175) 8(-2.425,-0.175) 9(-2.425,-0.525) 10(-2.425,-0.875) 11(-2.425,-1.225) 12(-2.425,-1.575) 13(-2.425,-1.925) 14(-2.425,-2.275) 25(2.425,-2.275) 26(2.425,-1.925) 27(2.425,-1.575) 28(2.425,-1.225) 29(2.425,-0.875) 30(2.425,-0.525) 31(2.425,-0.175) 32(2.425,0.175) 33(2.425,0.525) 34(2.425,0.875) 35(2.425,1.225) 36(2.425,1.575) 37(2.425,1.925) 38(2.425,2.275)
  rrect20% 0.2x0.8 smd paste-0.025 mask+0.05: 15(-1.575,-2.425) 16(-1.225,-2.425) 17(-0.875,-2.425) 18(-0.525,-2.425) 19(-0.175,-2.425) 20(0.175,-2.425) 21(0.525,-2.425) 22(0.875,-2.425) 23(1.225,-2.425) 24(1.575,-2.425) 39(1.575,2.425) 40(1.225,2.425) 41(0.875,2.425) 42(0.525,2.425) 43(0.175,2.425) 44(-0.175,2.425) 45(-0.525,2.425) 46(-0.875,2.425) 47(-1.225,2.425) 48(-1.575,2.425)
  rrect5% 3.7x3.7 smd paste-3 mask+0.05: 49(0,0)
via 1.1,-1.1 diameter 0.5 hole 0.2
via 0,-1.1 diameter 0.5 hole 0.2
via -1.1,-1.1 diameter 0.5 hole 0.2
via 1.1,0 diameter 0.5 hole 0.2
via 0,0 diameter 0.5 hole 0.2
via -1.1,0 diameter 0.5 hole 0.2
via 1.1,1.1 diameter 0.5 hole 0.2
via 0,1.1 diameter 0.5 hole 0.2
via -1.1,1.1 diameter 0.5 hole 0.2
Top Overlay:
  circle w0.25: c-3.048,2.769 r0.125
  lines w0.127: -2.592,2.547 -2.592,2.597 -1.906,2.597 ; -2.591,-2.54 -2.591,-2.591 -1.905,-2.591 ; 1.904,-2.588 2.59,-2.588 2.59,-2.537 ; 1.904,2.597 2.59,2.597 2.59,2.547
Top Paste:
  region: 0.2,-0.2 0.2,-1.7 1.7,-1.7 1.7,-0.2
  region: -0.2,-0.2 -1.7,-0.2 -1.7,-1.7 -0.2,-1.7
  region: -0.2,0.2 -0.2,1.7 -1.7,1.7 -1.7,0.2
  rectangle: 0.2,0.2 1.7,1.7
  region: 0.225,-0.225 1.395,-0.225 1.395,-1.397 0.225,-1.397
  region: -1.395,-0.225 -0.225,-0.225 -0.225,-1.395 -1.395,-1.395
  region: -1.398,1.395 -0.225,1.395 -0.225,0.225 -1.398,0.225
  region: 0.225,1.395 1.395,1.395 1.395,0.225 0.225,0.225
Top Assembly Drawing:
  circle w0.1: c-2.083,2.057 r0.254
  lines w0.127: -2.525,-2.525 2.525,-2.525 2.525,2.525 -2.525,2.525 -2.525,-2.525
Bottom Designators:
  lines w0.127: -2.53,-2.53 -2.53,2.53 ; -2.53,-2.53 2.53,-2.53 ; -2.53,-2.53 -2.53,2.53 ; -2.53,-2.53 2.53,-2.53 ; -2.53,2.53 2.53,2.53 ; -2.53,2.53 2.53,2.53 ; 2.53,-2.53 2.53,2.53 ; 2.53,-2.53 2.53,2.53
Top Courtyard:
  lines w0.1: -0.5,0 0.5,0 ; 0,-0.5 0,0.5
  lines w0.127: -3.075,-3.075 3.075,-3.075 3.075,3.075 -3.075,3.075 -3.075,-3.075
Bottom Courtyard:
  lines w0.05: -3.1,-3.1 -3.1,3.1 3.1,3.1 3.1,-3.1 -3.1,-3.1
3D body "QFN35P500X500X80_HS-49N.step": height 0.8, standoff 0, extent -2.526,-2.526 2.526,2.526

## COM_WIFI_ESP32-D0WDQ6-V3 [mm]
pads (49):
  rrect20% 0.85x0.2 smd paste-0.025 mask+0.05: 1(-2.9,2.2) 2(-2.9,1.8) 3(-2.9,1.4) 4(-2.9,1) 5(-2.9,0.6) 6(-2.9,0.2) 7(-2.9,-0.2) 8(-2.9,-0.6) 9(-2.9,-1) 10(-2.9,-1.4) 11(-2.9,-1.8) 12(-2.9,-2.2) 25(2.9,-2.2) 26(2.9,-1.8) 27(2.9,-1.4) 28(2.9,-1) 29(2.9,-0.6) 30(2.9,-0.2) 31(2.9,0.2) 32(2.9,0.6) 33(2.9,1) 34(2.9,1.4) 35(2.9,1.8) 36(2.9,2.2)
  rrect20% 0.2x0.85 smd paste-0.025 mask+0.05: 13(-2.2,-2.9) 14(-1.8,-2.9) 15(-1.4,-2.9) 16(-1,-2.9) 17(-0.6,-2.9) 18(-0.2,-2.9) 19(0.2,-2.9) 20(0.6,-2.9) 21(1,-2.9) 22(1.4,-2.9) 23(1.8,-2.9) 24(2.2,-2.9) 37(2.2,2.9) 38(1.8,2.9) 39(1.4,2.9) 40(1,2.9) 41(0.6,2.9) 42(0.2,2.9) 43(-0.2,2.9) 44(-0.6,2.9) 45(-1,2.9) 46(-1.4,2.9) 47(-1.8,2.9) 48(-2.2,2.9)
  rect 4.3x4.3 smd paste-4.3 mask+0.05: 49(0,0)
via 1.65,-1.65 diameter 0.5 hole 0.254
via 0.55,-1.65 diameter 0.5 hole 0.254
via -0.55,-1.65 diameter 0.5 hole 0.254
via -1.65,-1.65 diameter 0.5 hole 0.254
via 1.65,-0.55 diameter 0.5 hole 0.254
via -1.65,-0.55 diameter 0.5 hole 0.254
via 1.65,0.55 diameter 0.5 hole 0.254
via 1.65,1.65 diameter 0.5 hole 0.254
via 0.55,1.65 diameter 0.5 hole 0.254
via -0.55,1.65 diameter 0.5 hole 0.254
via -1.65,1.65 diameter 0.5 hole 0.254
via -1.65,0.55 diameter 0.5 hole 0.254
via -0.55,-0.55 diameter 0.5 hole 0.254
via 0.55,-0.55 diameter 0.5 hole 0.254
via -0.55,0.55 diameter 0.5 hole 0.254
via 0.55,0.5 diameter 0.5 hole 0.254
Top Overlay:
  circle w0.25: c-3.825,3.025 r0.125
  lines w0.2: -3.175,-2.7 -3.175,-3.175 -2.7,-3.175 ; -3.175,2.7 -3.175,3.175 -2.7,3.175 ; 2.7,-3.175 3.175,-3.175 3.175,-2.7 ; 2.7,3.175 3.175,3.175 3.175,2.7
Top Paste:
  rectangle: 0.175,0.175 1.925,1.925
  region: -0.175,0.175 -0.175,1.925 -1.925,1.925 -1.925,0.175
  region: -0.175,-0.175 -1.925,-0.175 -1.925,-1.925 -0.175,-1.925
  region: 0.175,-0.175 0.175,-1.925 1.925,-1.925 1.925,-0.175
Top Assembly Drawing:
  circle w0.1: c-2.125,2.125 r0.5
  lines w0.1: -3.025,-3.025 3.025,-3.025 3.025,3.025 -3.025,3.025 -3.025,-3.025
Top Courtyard:
  lines w0.05: -3.575,-3.575 3.575,-3.575 3.575,3.575 -3.575,3.575 -3.575,-3.575
  lines w0.1: -0.5,0 0.5,0 ; 0,-0.5 0,0.5
3D body: height 0.9, standoff 0, extent -3.025,-3.025 3.025,3.025